# Altium footprint library 六角铜柱.PcbLib: 49 footprints (part 1 of 4)
Each footprint in its own frame and in the unit in brackets; x right, y up, seen from the top. Pads: shape width x height; smd on the part's side, far side on the other; paste and mask are expansions set on the pad; w line width, h text height; cw(c..) or ccw(c..) is an arc to the next point about the centre after c.
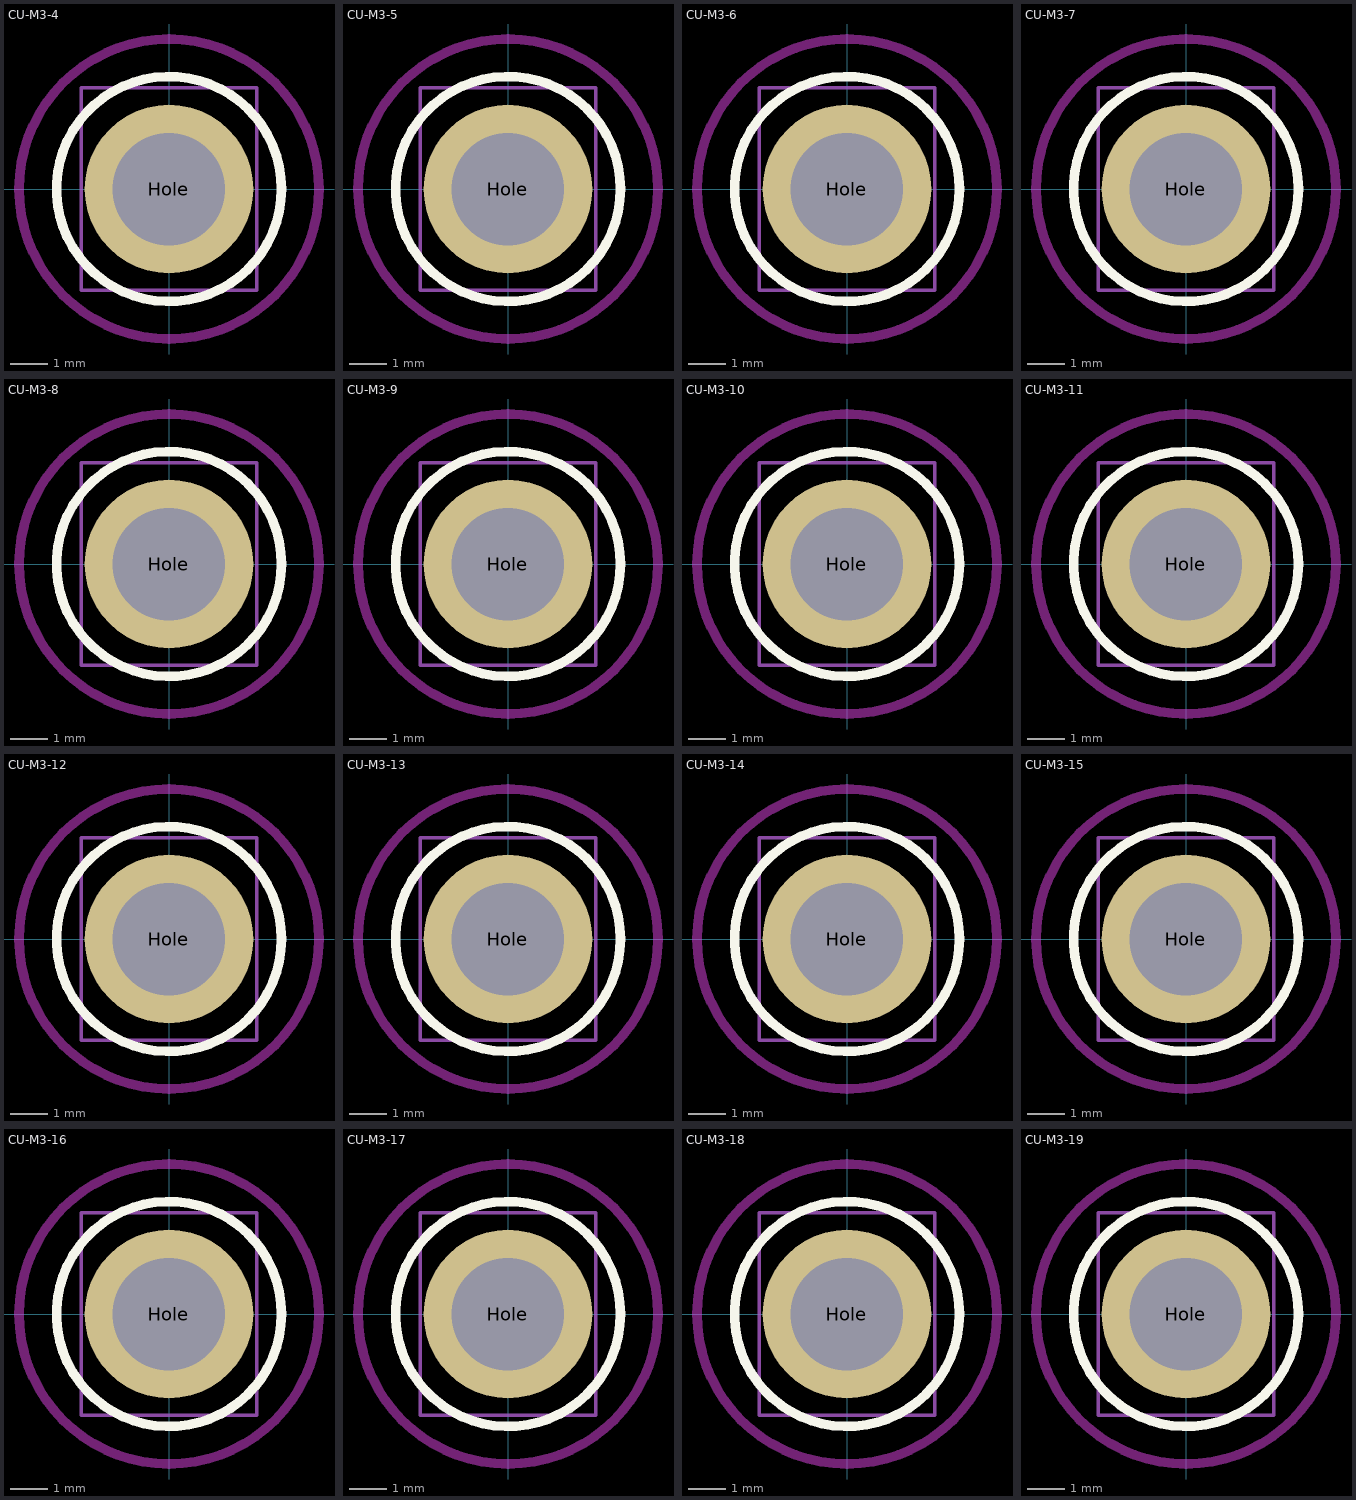
[diagram p0: the footprints below, top view; thin cyan lines are the x and y axes]

## CU-M3-4 [mm] "空心4mm长M3六角铜柱"
height 4
pads (1):
  round 4.5 hole 3: Hole(0,0)
Top Overlay:
  circle w0.254: c0,0 r3
Keep-Out Layer:
  circle w0.254: c0,0 r4
Mechanical 1:
  circle w0.15: c0,0 r1.5
Mechanical 13:
  lines w0.1: -2.34,-2.702 -2.34,2.702 2.34,2.702 2.34,-2.702 -2.34,-2.702
Mechanical 15:
  lines w0.1: -1,0 1,0 ; 0,-1 0,1
3D body: height 4, standoff 0, extent -2.34,-2.702 2.34,2.702

## CU-M3-5 [mm] "空心5mm长M3六角铜柱"
height 5
pads (1):
  round 4.5 hole 3: Hole(0,0)
Top Overlay:
  circle w0.254: c0,0 r3
Keep-Out Layer:
  circle w0.254: c0,0 r4
Mechanical 1:
  circle w0.15: c0,0 r1.5
Mechanical 13:
  lines w0.1: -2.34,-2.702 -2.34,2.702 2.34,2.702 2.34,-2.702 -2.34,-2.702
Mechanical 15:
  lines w0.1: -1,0 1,0 ; 0,-1 0,1
3D body: height 5, standoff 0, extent -2.34,-2.702 2.34,2.702

## CU-M3-6 [mm] "空心6mm长M3六角铜柱"
height 6
pads (1):
  round 4.5 hole 3: Hole(0,0)
Top Overlay:
  circle w0.254: c0,0 r3
Keep-Out Layer:
  circle w0.254: c0,0 r4
Mechanical 1:
  circle w0.15: c0,0 r1.5
Mechanical 13:
  lines w0.1: -2.34,-2.702 -2.34,2.702 2.34,2.702 2.34,-2.702 -2.34,-2.702
Mechanical 15:
  lines w0.1: -1,0 1,0 ; 0,-1 0,1
3D body: height 6, standoff 0, extent -2.34,-2.702 2.34,2.702

## CU-M3-7 [mm] "空心7mm长M3六角铜柱"
height 7
pads (1):
  round 4.5 hole 3: Hole(0,0)
Top Overlay:
  circle w0.254: c0,0 r3
Keep-Out Layer:
  circle w0.254: c0,0 r4
Mechanical 1:
  circle w0.15: c0,0 r1.5
Mechanical 13:
  lines w0.1: -2.34,-2.702 -2.34,2.702 2.34,2.702 2.34,-2.702 -2.34,-2.702
Mechanical 15:
  lines w0.1: -1,0 1,0 ; 0,-1 0,1
3D body: height 7, standoff 0, extent -2.34,-2.702 2.34,2.702

## CU-M3-8 [mm] "空心8mm长M3六角铜柱"
height 8
pads (1):
  round 4.5 hole 3: Hole(0,0)
Top Overlay:
  circle w0.254: c0,0 r3
Keep-Out Layer:
  circle w0.254: c0,0 r4
Mechanical 1:
  circle w0.15: c0,0 r1.5
Mechanical 13:
  lines w0.1: -2.34,-2.702 -2.34,2.702 2.34,2.702 2.34,-2.702 -2.34,-2.702
Mechanical 15:
  lines w0.1: -1,0 1,0 ; 0,-1 0,1
3D body: height 8, standoff 0, extent -2.34,-2.702 2.34,2.702

## CU-M3-9 [mm] "空心9mm长M3六角铜柱"
height 9
pads (1):
  round 4.5 hole 3: Hole(0,0)
Top Overlay:
  circle w0.254: c0,0 r3
Keep-Out Layer:
  circle w0.254: c0,0 r4
Mechanical 1:
  circle w0.15: c0,0 r1.5
Mechanical 13:
  lines w0.1: -2.34,-2.702 2.34,-2.702 2.34,2.702 -2.34,2.702 -2.34,-2.702
Mechanical 15:
  lines w0.1: -1,0 1,0 ; 0,-1 0,1
3D body: height 9, standoff 0, extent -2.34,-2.702 2.34,2.702

## CU-M3-10 [mm] "空心10mm长M3六角铜柱"
height 10
pads (1):
  round 4.5 hole 3: Hole(0,0)
Top Overlay:
  circle w0.254: c0,0 r3
Keep-Out Layer:
  circle w0.254: c0,0 r4
Mechanical 1:
  circle w0.15: c0,0 r1.5
Mechanical 13:
  lines w0.1: -2.34,-2.702 2.34,-2.702 2.34,2.702 -2.34,2.702 -2.34,-2.702
Mechanical 15:
  lines w0.1: -1,0 1,0 ; 0,-1 0,1
3D body: height 10, standoff 0, extent -2.34,-2.702 2.34,2.702

## CU-M3-11 [mm] "空心11mm长M3六角铜柱"
height 11
pads (1):
  round 4.5 hole 3: Hole(0,0)
Top Overlay:
  circle w0.254: c0,0 r3
Keep-Out Layer:
  circle w0.254: c0,0 r4
Mechanical 1:
  circle w0.15: c0,0 r1.5
Mechanical 13:
  lines w0.1: -2.34,-2.702 -2.34,2.702 2.34,2.702 2.34,-2.702 -2.34,-2.702
Mechanical 15:
  lines w0.1: -1,0 1,0 ; 0,-1 0,1
3D body: height 11, standoff 0, extent -2.34,-2.702 2.34,2.702

## CU-M3-12 [mm] "空心12mm长M3六角铜柱"
height 12
pads (1):
  round 4.5 hole 3: Hole(0,0)
Top Overlay:
  circle w0.254: c0,0 r3
Keep-Out Layer:
  circle w0.254: c0,0 r4
Mechanical 1:
  circle w0.15: c0,0 r1.5
Mechanical 13:
  lines w0.1: -2.34,-2.702 2.34,-2.702 2.34,2.702 -2.34,2.702 -2.34,-2.702
Mechanical 15:
  lines w0.1: -1,0 1,0 ; 0,-1 0,1
3D body: height 12, standoff 0, extent -2.34,-2.702 2.34,2.702

## CU-M3-13 [mm] "空心13mm长M3六角铜柱"
height 13
pads (1):
  round 4.5 hole 3: Hole(0,0)
Top Overlay:
  circle w0.254: c0,0 r3
Keep-Out Layer:
  circle w0.254: c0,0 r4
Mechanical 1:
  circle w0.15: c0,0 r1.5
Mechanical 13:
  lines w0.1: -2.34,-2.702 2.34,-2.702 2.34,2.702 -2.34,2.702 -2.34,-2.702
Mechanical 15:
  lines w0.1: -1,0 1,0 ; 0,-1 0,1
3D body: height 13, standoff 0, extent -2.34,-2.702 2.34,2.702

## CU-M3-14 [mm] "空心14mm长M3六角铜柱"
height 14
pads (1):
  round 4.5 hole 3: Hole(0,0)
Top Overlay:
  circle w0.254: c0,0 r3
Keep-Out Layer:
  circle w0.254: c0,0 r4
Mechanical 1:
  circle w0.15: c0,0 r1.5
Mechanical 13:
  lines w0.1: -2.34,-2.702 2.34,-2.702 2.34,2.702 -2.34,2.702 -2.34,-2.702
Mechanical 15:
  lines w0.1: -1,0 1,0 ; 0,-1 0,1
3D body: height 14, standoff 0, extent -2.34,-2.702 2.34,2.702

## CU-M3-15 [mm] "空心15mm长M3六角铜柱"
height 15
pads (1):
  round 4.5 hole 3: Hole(0,0)
Top Overlay:
  circle w0.254: c0,0 r3
Keep-Out Layer:
  circle w0.254: c0,0 r4
Mechanical 1:
  circle w0.15: c0,0 r1.5
Mechanical 13:
  lines w0.1: -2.34,-2.702 2.34,-2.702 2.34,2.702 -2.34,2.702 -2.34,-2.702
Mechanical 15:
  lines w0.1: -1,0 1,0 ; 0,-1 0,1
3D body: height 15, standoff 0, extent -2.34,-2.702 2.34,2.702

## CU-M3-16 [mm] "空心16mm长M3六角铜柱"
height 16
pads (1):
  round 4.5 hole 3: Hole(0,0)
Top Overlay:
  circle w0.254: c0,0 r3
Keep-Out Layer:
  circle w0.254: c0,0 r4
Mechanical 1:
  circle w0.15: c0,0 r1.5
Mechanical 13:
  lines w0.1: -2.34,-2.702 2.34,-2.702 2.34,2.702 -2.34,2.702 -2.34,-2.702
Mechanical 15:
  lines w0.1: -1,0 1,0 ; 0,-1 0,1
3D body: height 16, standoff 0, extent -2.34,-2.702 2.34,2.702

## CU-M3-17 [mm] "空心17mm长M3六角铜柱"
height 17
pads (1):
  round 4.5 hole 3: Hole(0,0)
Top Overlay:
  circle w0.254: c0,0 r3
Keep-Out Layer:
  circle w0.254: c0,0 r4
Mechanical 1:
  circle w0.15: c0,0 r1.5
Mechanical 13:
  lines w0.1: -2.34,-2.702 2.34,-2.702 2.34,2.702 -2.34,2.702 -2.34,-2.702
Mechanical 15:
  lines w0.1: -1,0 1,0 ; 0,-1 0,1
3D body: height 17, standoff 0, extent -2.34,-2.702 2.34,2.702

## CU-M3-18 [mm] "空心18mm长M3六角铜柱"
height 18
pads (1):
  round 4.5 hole 3: Hole(0,0)
Top Overlay:
  circle w0.254: c0,0 r3
Keep-Out Layer:
  circle w0.254: c0,0 r4
Mechanical 1:
  circle w0.15: c0,0 r1.5
Mechanical 13:
  lines w0.1: -2.34,-2.702 2.34,-2.702 2.34,2.702 -2.34,2.702 -2.34,-2.702
Mechanical 15:
  lines w0.1: -1,0 1,0 ; 0,-1 0,1
3D body: height 18, standoff 0, extent -2.34,-2.702 2.34,2.702

## CU-M3-19 [mm] "空心19mm长M3六角铜柱"
height 19
pads (1):
  round 4.5 hole 3: Hole(0,0)
Top Overlay:
  circle w0.254: c0,0 r3
Keep-Out Layer:
  circle w0.254: c0,0 r4
Mechanical 1:
  circle w0.15: c0,0 r1.5
Mechanical 13:
  lines w0.1: -2.34,-2.702 -2.34,2.702 2.34,2.702 2.34,-2.702 -2.34,-2.702
Mechanical 15:
  lines w0.1: -1,0 1,0 ; 0,-1 0,1
3D body: height 19, standoff 0, extent -2.34,-2.702 2.34,2.702